# Altium schematic symbol library LATTICEPLDS_Library.SchLib: 291 symbols (part 7 of 32) (continued)
## LCMXO3L/LF-9400-BG484 (continued)
part C pins: A2 PT9B_L_GPLLC (io), A3 PT10B (io), A4 PT11B (io), A5 PT12B (io), A6 PT13B (io), A7 PT14B (io), A8 PT20B (io), A9 PT21B (io), A10 PT23B_PCLKC0_1 (io), A11 PT24B (io), A12 PT27D_SDA/PCLKC0_0 (io), A13 PT29A (io), A14 PT30A (io), A15 PT38A (io), A16 PT39A (io), A17 PT40A (io), A18 PT41A (io), A19 PT42A (io), A20 PT43A_R_GPLLT (io), A21 PT44A_R_GPLLT (io), B1 PT9A_L_GPLLT (io), B2 PT10A (io), B3 PT11A (io), B4 PT12A (io), B5 PT13A (io), B6 PT14A (io), B8 PT20A (io), B9 PT21A (io), B10 PT23A_PCLKT0_1 (io), B11 PT24A (io), B12 PT27C_SCL/PCLKT0_0 (io), B13 PT29B (io), B14 PT30B (io), B15 PT38B (io), B17 PT39B (io), B18 PT40B (io), B19 PT41B (io), B20 PT42B (io), B21 PT43B_R_GPLLC (io), B22 PT44B_R_GPLLC (io), C3 PT10C (io), C4 PT10D (io), C5 PT12D (io), C6 PT14C (io), C8 PT15A (io), C9 PT20C (io), C13 PT29C (io), C14 PT30C (io), C15 PT38C (io), C17 PT39C (io), C18 PT41C (io), C19 PT43C (io), C20 PT43D (io), D5 PT12C (io), D6 PT13C (io), D7 PT14D (io), D8 PT15B (io), D9 PT20D (io), D11 PT24D (io), D12 PT27A (io), D13 PT29D (io), D14 PT30D (io), D15 PT38D (io), D16 PT39D (io), D17 PT40D (io), D18 PT41D (io), E6 PT9C (io), E7 PT13D (io), E10 PT22B (io), E11 PT24C (io), E12 PT27B (io), E13 PT28C (io), E16 PT40C (io), F7 PT9D (io), F8 PT11C (io), F9 PT21C (io), F10 PT22A (io), F11 PT23D (io), F12 PT28B (io), F13 PT28D (io), F14 PT31B (io), F15 PT42C (io), G8 PT11D (io), G9 PT21D (io), G11 PT23C (io), G12 PT28A (io), G14 PT31A (io), G15 PT42D (io)
part D pins: C10 PT22D_TMS (io), D10 PT22C_TCK (io), E8 PT15C_TDO (io), E9 PT15D_TDI (io), E14 PT31C_JTAGENB (io), E15 PT31D_PROGRAMN (io), E17 PT44D_DONE (io), F16 PT44C_INITN (io)
part E pins: C7 VCCIO0_1, C12 VCCIO0_2, C16 VCCIO0_3, F3 VCCIO5_1, F20 VCCIO1_1, G10 VCCIO0_4, G13 VCCIO0_5, H9 VCCIO0_6, H11 VCCIO0_7, H12 VCCIO0_8, H14 VCCIO0_9, J8 VCCIO5_2, J15 VCCIO1_2, K8 VCCIO5_3, K10 VCC1, K11 VCC2, K12 VCC3, K13 VCC4, K15 VCCIO1_3, L8 VCCIO4_1, L11 VCC5, L12 VCC6, L15 VCCIO1_4, M3 VCCIO4_3, M8 VCCIO4_2, M11 VCC7, M12 VCC8, M15 VCCIO1_5, M18 VCCIO1_6, N8 VCCIO3_1, N10 VCC9, N11 VCC10, N12 VCC11, N13 VCC12, N15 VCCIO1_7, P8 VCCIO3_2, P15 VCCIO1_8, R9 VCCIO2_1, R10 VCCIO2_2, R11 VCCIO2_3, R12 VCCIO2_4, R13 VCCIO2_5, R14 VCCIO2_6, V3 VCCIO3_3, V20 VCCIO1_9, W7 VCCIO2_7, W11 VCCIO2_8, W16 VCCIO2_9
part F pins: A1 GND1, A22 GND2, AB1 GND51, AB22 GND52, B7 GND3, B16 GND4, C2 GND5, C11 GND6, E5 GND7, E18 GND8, F2 GND9, F21 GND10, H8 GND11, H10 GND12, H13 GND13, H15 GND14, J9 GND15, J10 GND16, J11 GND17, J12 GND18, J13 GND19, J14 GND20, K9 GND21, K14 GND22, K21 GND23, L2 GND24, L9 GND25, L10 GND26, L13 GND27, L14 GND28, L18 GND29, M4 GND30, M9 GND31, M10 GND32, M13 GND33, M14 GND34, N9 GND35, N14 GND36, N21 GND37, P9 GND38, P10 GND39, P11 GND40, P12 GND41, P13 GND42, P14 GND43, R8 GND44, R15 GND45, V2 GND46, V21 GND47, W12 GND48, Y7 GND49, Y16 GND50
part G pins: AA22 PR29A (io), C21 PR2A_R_GPLLT_FB (io), C22 PR2B_R_GPLLC_FB (io), D19 PR3C (io), D20 PR3D (io), D21 PR3B_R_GPLLC_IN (io), D22 PR3A_R_GPLLT_IN (io), E19 PR4C (io), E20 PR4D (io), E21 PR4B (io), E22 PR4A (io), F17 PR2C (io), F18 PR5C (io), F19 PR5D (io), F22 PR5A (io), G16 PR2D (io), G17 PR7C (io), G18 PR6D (io), G19 PR6C (io), G20 PR6B (io), G21 PR6A (io), G22 PR5B (io), H16 PR10D (io), H17 PR10C (io), H18 PR10B (io), H19 PR10A (io), H20 PR7D (io), H21 PR7B (io), H22 PR7A (io), J16 PR11A (io), J17 PR11B (io), J18 PR11C (io), J19 PR11D (io), J20 PR12C (io), J21 PR12A (io), J22 PR12B (io), K16 PR13D (io), K17 PR13C (io), K18 PR13B (io), K19 PR13A (io), K20 PR12D (io), K22 PR16A (io), L16 PR14B (io), L17 PR14A (io), L19 PR14C (io), L20 PR14D (io), L21 PR16B (io), L22 PR16C (io), M16 PR18A (io), M17 PR16D (io), M19 PR17D (io), M20 PR17C (io), M21 PR17B_PCLKC1_0 (io), M22 PR17A_PCLKT1_0 (io), N16 PR18B (io), N17 PR18C (io), N18 PR18D (io), N19 PR19D (io), N20 PR19C (io), N22 PR19A (io), P16 PR24B (io), P17 PR24A (io), P18 PR21D (io), P19 PR21C (io), P20 PR20D (io), P21 PR19B (io), P22 PR20C (io), R16 PR26C (io), R17 PR26B (io), R18 PR26A (io), R19 PR25D (io), R20 PR25C (io), R21 PR20B (io), R22 PR20A (io), T17 PR27C (io), T18 PR27B (io), T19 PR27A (io), T20 PR26D (io), T21 PR21B (io), T22 PR21A (io), U17 PR29C (io), U18 PR28D (io), U19 PR28C (io), U20 PR27D (io), U21 PR24D (io), U22 PR24C (io), V18 PR30A (io), V19 PR29D (io), V22 PR25A (io), W19 PR30C (io), W20 PR30B (io), W21 PR28B (io), W22 PR25B (io), Y20 PR30D (io), Y21 PR29B (io), Y22 PR28A (io)
part A text: BANK 5; BANK 3; BANK 4
part B text: BANK 2
part C text: BANK 0
part D text: BANK 0
part G text: BANK 1

## LCMXO256-M100/MN100
designator U?  Data Sheet Version: 2.5
SWAP_INFO: (S1+S2); SPLIT_INST: TRUE
part A pins: A1 PT2B (io), A2 PT2D (io), A3 PT2F (io), A4 GNDIO0 (power), A5 PT3B (io), A6 PT3C (io), A7 PT3D (io), A8 PT4B (PCLK0_1) (io), A9 PT4C (io), A10 PT4E (io), A11 PT5A (io), A12 PT5C (io), A13 PR2A (io), A14 VCCIO0 (power), B1 PL2A (io), B2 PT2A (io), B3 PT2E (io), B4 PT3A (io), B5 VCCIO0 (power), B8 PT4A (PCLK0_0) (io), B10 PT4D (io), B11 PT5B (io), B12 PT4F (io), B13 GNDIO0 (power), B14 PR3A (io), C1 PL2B (io), C2 PL3C (io), C3 PT2C (io), C12 PR2B (io), C13 PR3B (io), C14 PR3C (io), D1 PL3B (io), D2 PL3A (io), D13 PR3D (io), D14 PR4A (io), E1 PL3D (io), E2 PL4A (io), E13 PR4B (io), E14 PR5A (io), F1 PL4B (io), F2 PL5A (io), F13 PR5B (io), F14 PR5C (io), G1 VCCIO1 (power), G2 PL5B (io), G13 PR5D (io), G14 GNDIO0 (power), H1 GNDIO1 (power), H2 PL5C (io), H13 PR6A (io), H14 VCCIO0 (power), J1 PL5D (GSRN) (io), J2 PL6A (io), J13 PR6B (io), J14 PR7A (io), K1 PL6B (TSALL) (io), K2 PL7A (io), K13 PR7B (io), K14 PR7C (io), L1 PL7B (io), L2 PL7C (io), L13 PR8B (io), L14 PR8A (io), M1 PL7D (io), M2 PL8A (io), M3 PL9A (io), M13 PR7D (io), M14 PR9A (io), N1 PL8B (io), N2 GNDIO1 (power), N3 PB2B (io), N4 TCK (io), N5 PB2C (io), N6 PB2D (io), N7 PB3A (PCLK1_1) (io), N8 PB3C (PCLK1_0) (io), N10 GNDIO1 (power), N11 PB4B (io), N12 PB4D (io), N13 PB5D (io), N14 PR9B (io), P1 VCCIO1 (power), P2 TMS (io), P3 PL9B (io), P4 PB2A (io), P5 TDO (io), P6 TDI (io), P8 PB3B (io), P9 PB3D (io), P10 VCCIO1 (power), P11 PB4A (io), P12 PB4C (io), P13 PB5A (io), P14 PB5C (io)
part B pins: B6 VCC (power), B7 VCCAUX (power), B9 GND (power), M12 SLEEPN (io), N9 GND (power), P7 VCC (power)
part A text: (1 of 2)
part B text: (2 of 2); M12 is NC for E devices

## LCMXO256-T100/TN100
designator U?  Data Sheet Version: 2.7
pins: 1 PL2A, 2 PL2B, 3 PL3A, 4 PL3B, 5 PL3C, 6 PL3D, 7 PL4A, 8 PL4B, 9 PL5A, 10 VCCIO1, 11 PL5B, 12 GNDIO1, 13 PL5C, 14 PL5D, 15 PL6A, 16 PL6B, 17 PL7A, 18 PL7B, 19 PL7C, 20 PL7D, 21 PL8A, 22 PL8B, 23 PL9A, 24 VCCIO1, 25 GNDIO1, 26 TMS, 27 PL9B, 28 TCK, 29 PB2A, 30 PB2B, 31 TDO, 32 PB2C, 33 TDI, 34 PB2D, 35 VCC, 36 PB3A, 37 PB3B, 38 PB3C, 39 PB3D, 40 GND, 41 VCCIO1, 42 GNDIO1, 43 PB4A, 44 PB4B, 45 PB4C, 46 PB4D, 47 PB5A, 48 SLEEPN/NC, 49 PB5C, 50 PB5D, 51 PR9B, 52 PR9A, 53 PR8B, 54 PR8A, 55 PR7D, 56 PR7C, 57 PR7B, 58 PR7A, 59 PR6B, 60 VCCIO0, 61 PR6A, 62 GNDIO0, 63 PR5D, 64 PR5C, 65 PR5B, 66 PR5A, 67 PR4B, 68 PR4A, 69 PR3D, 70 PR3C, 71 PR3B, 72 PR3A, 73 PR2B, 74 VCCIO0, 75 GNDIO0, 76 PR2A, 77 PT5C, 78 PT5B, 79 PT5A, 80 PT4F, 81 PT4E, 82 PT4D, 83 PT4C, 84 GND, 85 PT4B, 86 PT4A, 87 PT3D, 88 VCCAUX, 89 PT3C, 90 VCC, 91 PT3B, 92 VCCIO0, 93 GNDIO0, 94 PT3A, 95 PT2F, 96 PT2E, 97 PT2D, 98 PT2C, 99 PT2B, 100 PT2A

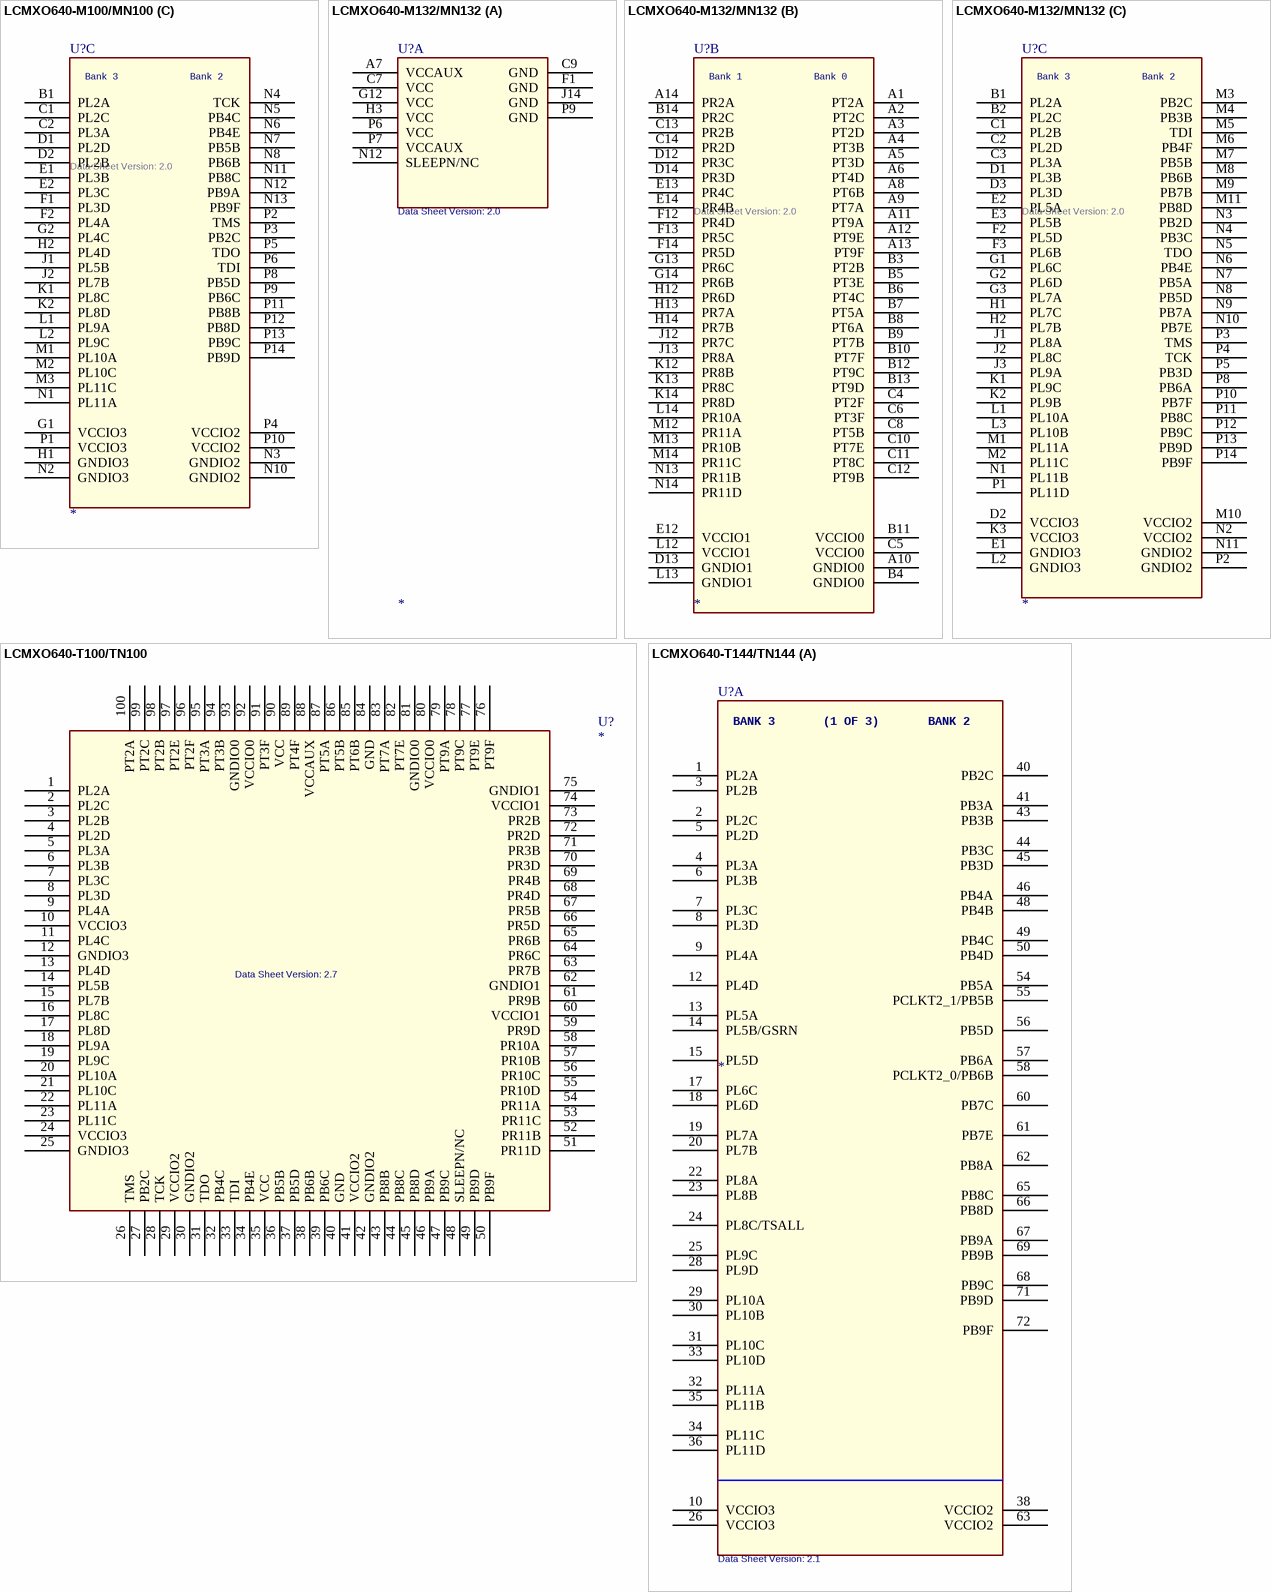
[diagram p69: symbols LCMXO640-M100/MN100 to LCMXO640-T144/TN144]

## LCMXO640-M100/MN100
designator U?  Data Sheet Version: 2.0
SPLIT_INST: TRUE; SWAP_INFO: (S1+S2+S3)
part A pins: B6 VCC (power), B7 VCCAUX (power), B9 GND (power), M12 SLEEPN/NC, N9 GND (power), P7 VCC (power)
part B pins: A1 PT2C, A2 PT2E, A3 PT3A, A4 GNDIO0 (power), A5 PT3F, A6 PT4F, A7 PT5A, A8 PT6B, A9 PT7A, A10 GNDIO0 (power), A11 PT9A, A12 PT9E, A13 PT9F, A14 VCCIO1, B2 PT2A, B3 PT2F, B4 PT3B, B5 VCCIO0, B8 PT5B, B10 PT7E, B11 PT9C, B12 VCCIO0, B13 GNDIO1 (power), B14 PR2D, C3 PT2B, C12 PR2B, C13 PR3B, C14 PR3D, D13 PR4B, D14 PR4D, E13 PR5B, E14 PR5D, F13 PR6B, F14 PR6C, G13 PR7B, G14 GNDIO1 (power), H13 PR9B, H14 VCCIO1, J13 PR9D, J14 PR10A, K13 PR10B, K14 PR10C, L13 PR11C, L14 PR11A, M13 PR10D, M14 PR11B, N14 PR11D
part C pins: B1 PL2A, C1 PL2C, C2 PL3A, D1 PL2D, D2 PL2B, E1 PL3B, E2 PL3C, F1 PL3D, F2 PL4A, G1 VCCIO3, G2 PL4C, H1 GNDIO3 (power), H2 PL4D, J1 PL5B, J2 PL7B, K1 PL8C, K2 PL8D, L1 PL9A, L2 PL9C, M1 PL10A, M2 PL10C, M3 PL11C, N1 PL11A, N2 GNDIO3 (power), N3 GNDIO2 (power), N4 TCK, N5 PB4C, N6 PB4E, N7 PB5B, N8 PB6B, N10 GNDIO2 (power), N11 PB8C, N12 PB9A, N13 PB9F, P1 VCCIO3, P2 TMS, P3 PB2C, P4 VCCIO2, P5 TDO, P6 TDI, P8 PB5D, P9 PB6C, P10 VCCIO2, P11 PB8B, P12 PB8D, P13 PB9C, P14 PB9D
part B text: Bank 1; Bank 0
part C text: Bank 3; Bank 2

## LCMXO640-M132/MN132
designator U?  Data Sheet Version: 2.0
SWAP_INFO: (S1+S2+S3); SPLIT_INST: TRUE
part A pins: A7 VCCAUX (power), C7 VCC (power), C9 GND (power), F1 GND (power), G12 VCC (power), H3 VCC (power), J14 GND (power), N12 SLEEPN/NC, P6 VCC (power), P7 VCCAUX (power), P9 GND (power)
part B pins: A1 PT2A, A2 PT2C, A3 PT2D, A4 PT3B, A5 PT3D, A6 PT4D, A8 PT6B, A9 PT7A, A10 GNDIO0 (power), A11 PT9A, A12 PT9E, A13 PT9F, A14 PR2A, B3 PT2B, B4 GNDIO0 (power), B5 PT3E, B6 PT4C, B7 PT5A, B8 PT6A, B9 PT7B, B10 PT7F, B11 VCCIO0, B12 PT9C, B13 PT9D, B14 PR2C, C4 PT2F, C5 VCCIO0, C6 PT3F, C8 PT5B, C10 PT7E, C11 PT8C, C12 PT9B, C13 PR2B, C14 PR2D, D12 PR3C, D13 GNDIO1 (power), D14 PR3D, E12 VCCIO1, E13 PR4C, E14 PR4B, F12 PR4D, F13 PR5C, F14 PR5D, G13 PR6C, G14 PR6B, H12 PR6D, H13 PR7A, H14 PR7B, J12 PR7C, J13 PR8A, K12 PR8B, K13 PR8C, K14 PR8D, L12 VCCIO1, L13 GNDIO1 (power), L14 PR10A, M12 PR11A, M13 PR10B, M14 PR11C, N13 PR11B, N14 PR11D
part C pins: B1 PL2A, B2 PL2C, C1 PL2B, C2 PL2D, C3 PL3A, D1 PL3B, D2 VCCIO3, D3 PL3D, E1 GNDIO3 (power), E2 PL5A, E3 PL5B, F2 PL5D, F3 PL6B, G1 PL6C, G2 PL6D, G3 PL7A, H1 PL7C, H2 PL7B, J1 PL8A, J2 PL8C, J3 PL9A, K1 PL9C, K2 PL9B, K3 VCCIO3, L1 PL10A, L2 GNDIO3 (power), L3 PL10B, M1 PL11A, M2 PL11C, M3 PB2C, M4 PB3B, M5 TDI, M6 PB4F, M7 PB5B, M8 PB6B, M9 PB7B, M10 VCCIO2, M11 PB8D, N1 PL11B, N2 VCCIO2, N3 PB2D, N4 PB3C, N5 TDO, N6 PB4E, N7 PB5A, N8 PB5D, N9 PB7A, N10 PB7E, N11 GNDIO2 (power), P1 PL11D, P2 GNDIO2 (power), P3 TMS, P4 TCK, P5 PB3D, P8 PB6A, P10 PB7F, P11 PB8C, P12 PB9C, P13 PB9D, P14 PB9F
part B text: Bank 1; Bank 0
part C text: Bank 3; Bank 2

## LCMXO640-T100/TN100
designator U?  Data Sheet Version: 2.7
pins: 1 PL2A, 2 PL2C, 3 PL2B, 4 PL2D, 5 PL3A, 6 PL3B, 7 PL3C, 8 PL3D, 9 PL4A, 10 VCCIO3, 11 PL4C, 12 GNDIO3, 13 PL4D, 14 PL5B, 15 PL7B, 16 PL8C, 17 PL8D, 18 PL9A, 19 PL9C, 20 PL10A, 21 PL10C, 22 PL11A, 23 PL11C, 24 VCCIO3, 25 GNDIO3, 26 TMS, 27 PB2C, 28 TCK, 29 VCCIO2, 30 GNDIO2, 31 TDO, 32 PB4C, 33 TDI, 34 PB4E, 35 VCC, 36 PB5B, 37 PB5D, 38 PB6B, 39 PB6C, 40 GND, 41 VCCIO2, 42 GNDIO2, 43 PB8B, 44 PB8C, 45 PB8D, 46 PB9A, 47 PB9C, 48 SLEEPN/NC, 49 PB9D, 50 PB9F, 51 PR11D, 52 PR11B, 53 PR11C, 54 PR11A, 55 PR10D, 56 PR10C, 57 PR10B, 58 PR10A, 59 PR9D, 60 VCCIO1, 61 PR9B, 62 GNDIO1, 63 PR7B, 64 PR6C, 65 PR6B, 66 PR5D, 67 PR5B, 68 PR4D, 69 PR4B, 70 PR3D, 71 PR3B, 72 PR2D, 73 PR2B, 74 VCCIO1, 75 GNDIO1, 76 PT9F, 77 PT9E, 78 PT9C, 79 PT9A, 80 VCCIO0, 81 GNDIO0, 82 PT7E, 83 PT7A, 84 GND, 85 PT6B, 86 PT5B, 87 PT5A, 88 VCCAUX, 89 PT4F, 90 VCC, 91 PT3F, 92 VCCIO0, 93 GNDIO0, 94 PT3B, 95 PT3A, 96 PT2F, 97 PT2E, 98 PT2B, 99 PT2C, 100 PT2A

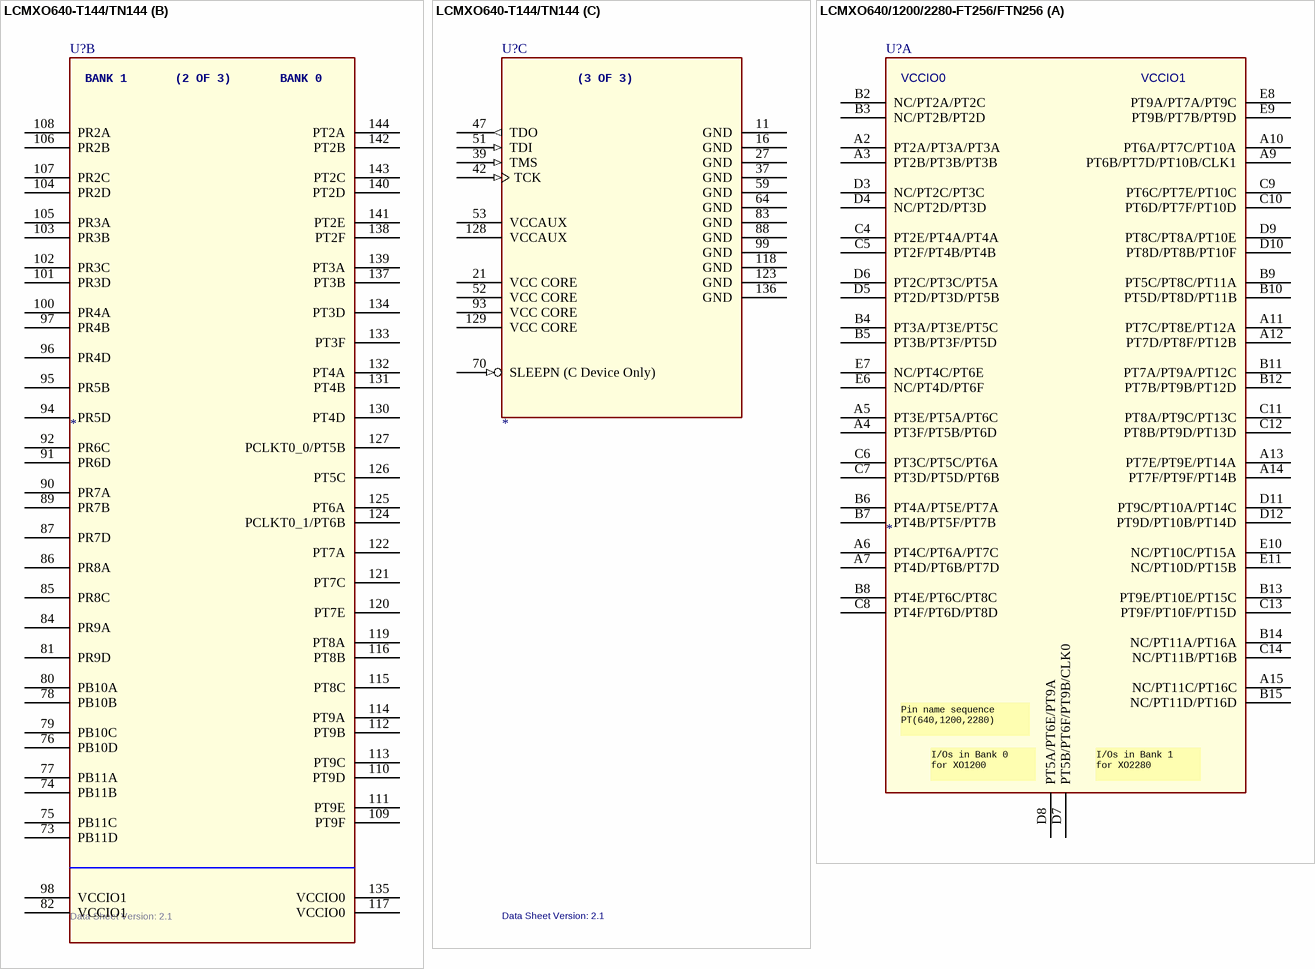
[diagram p70: symbols LCMXO640-T144/TN144 to LCMXO640/1200/2280-FT256/FTN256]

## LCMXO640-T144/TN144
designator U?  Data Sheet Version: 2.1
footprint TQFP144
part A pins: 1 PL2A, 2 PL2C, 3 PL2B, 4 PL3A, 5 PL2D, 6 PL3B, 7 PL3C, 8 PL3D, 9 PL4A, 10 VCCIO3 (power), 12 PL4D, 13 PL5A, 14 PL5B/GSRN, 15 PL5D, 17 PL6C, 18 PL6D, 19 PL7A, 20 PL7B, 22 PL8A, 23 PL8B, 24 PL8C/TSALL, 25 PL9C, 26 VCCIO3 (power), 28 PL9D, 29 PL10A, 30 PL10B, 31 PL10C, 32 PL11A, 33 PL10D, 34 PL11C, 35 PL11B, 36 PL11D, 38 VCCIO2 (power), 40 PB2C, 41 PB3A, 43 PB3B, 44 PB3C, 45 PB3D, 46 PB4A, 48 PB4B, 49 PB4C, 50 PB4D, 54 PB5A, 55 PCLKT2_1/PB5B, 56 PB5D, 57 PB6A, 58 PCLKT2_0/PB6B, 60 PB7C, 61 PB7E, 62 PB8A, 63 VCCIO2 (power), 65 PB8C, 66 PB8D, 67 PB9A, 68 PB9C, 69 PB9B, 71 PB9D, 72 PB9F
part B pins: 73 PB11D, 74 PB11B, 75 PB11C, 76 PB10D, 77 PB11A, 78 PB10B, 79 PB10C, 80 PB10A, 81 PR9D, 82 VCCIO1 (power), 84 PR9A, 85 PR8C, 86 PR8A, 87 PR7D, 89 PR7B, 90 PR7A, 91 PR6D, 92 PR6C, 94 PR5D, 95 PR5B, 96 PR4D, 97 PR4B, 98 VCCIO1 (power), 100 PR4A, 101 PR3D, 102 PR3C, 103 PR3B, 104 PR2D, 105 PR3A, 106 PR2B, 107 PR2C, 108 PR2A, 109 PT9F, 110 PT9D, 111 PT9E, 112 PT9B, 113 PT9C, 114 PT9A, 115 PT8C, 116 PT8B, 117 VCCIO0 (power), 119 PT8A, 120 PT7E, 121 PT7C, 122 PT7A, 124 PCLKT0_1/PT6B, 125 PT6A, 126 PT5C, 127 PCLKT0_0/PT5B, 130 PT4D, 131 PT4B, 132 PT4A, 133 PT3F, 134 PT3D, 135 VCCIO0 (power), 137 PT3B, 138 PT2F, 139 PT3A, 140 PT2D, 141 PT2E, 142 PT2B, 143 PT2C, 144 PT2A
part C pins: 11 GND (power), 16 GND (power), 21 VCC CORE (power), 27 GND (power), 37 GND (power), 39 TMS (in), 42 TCK (in), 47 TDO (out), 51 TDI (in), 52 VCC CORE (power), 53 VCCAUX (power), 59 GND (power), 64 GND (power), 70 SLEEPN (C Device Only) (in), 83 GND (power), 88 GND (power), 93 VCC CORE (power), 99 GND (power), 118 GND (power), 123 GND (power), 128 VCCAUX (power), 129 VCC CORE (power), 136 GND (power)
part A text: BANK 3; (1 OF 3); BANK 2
part B text: BANK 1; (2 OF 3); BANK 0
part C text: (3 OF 3)

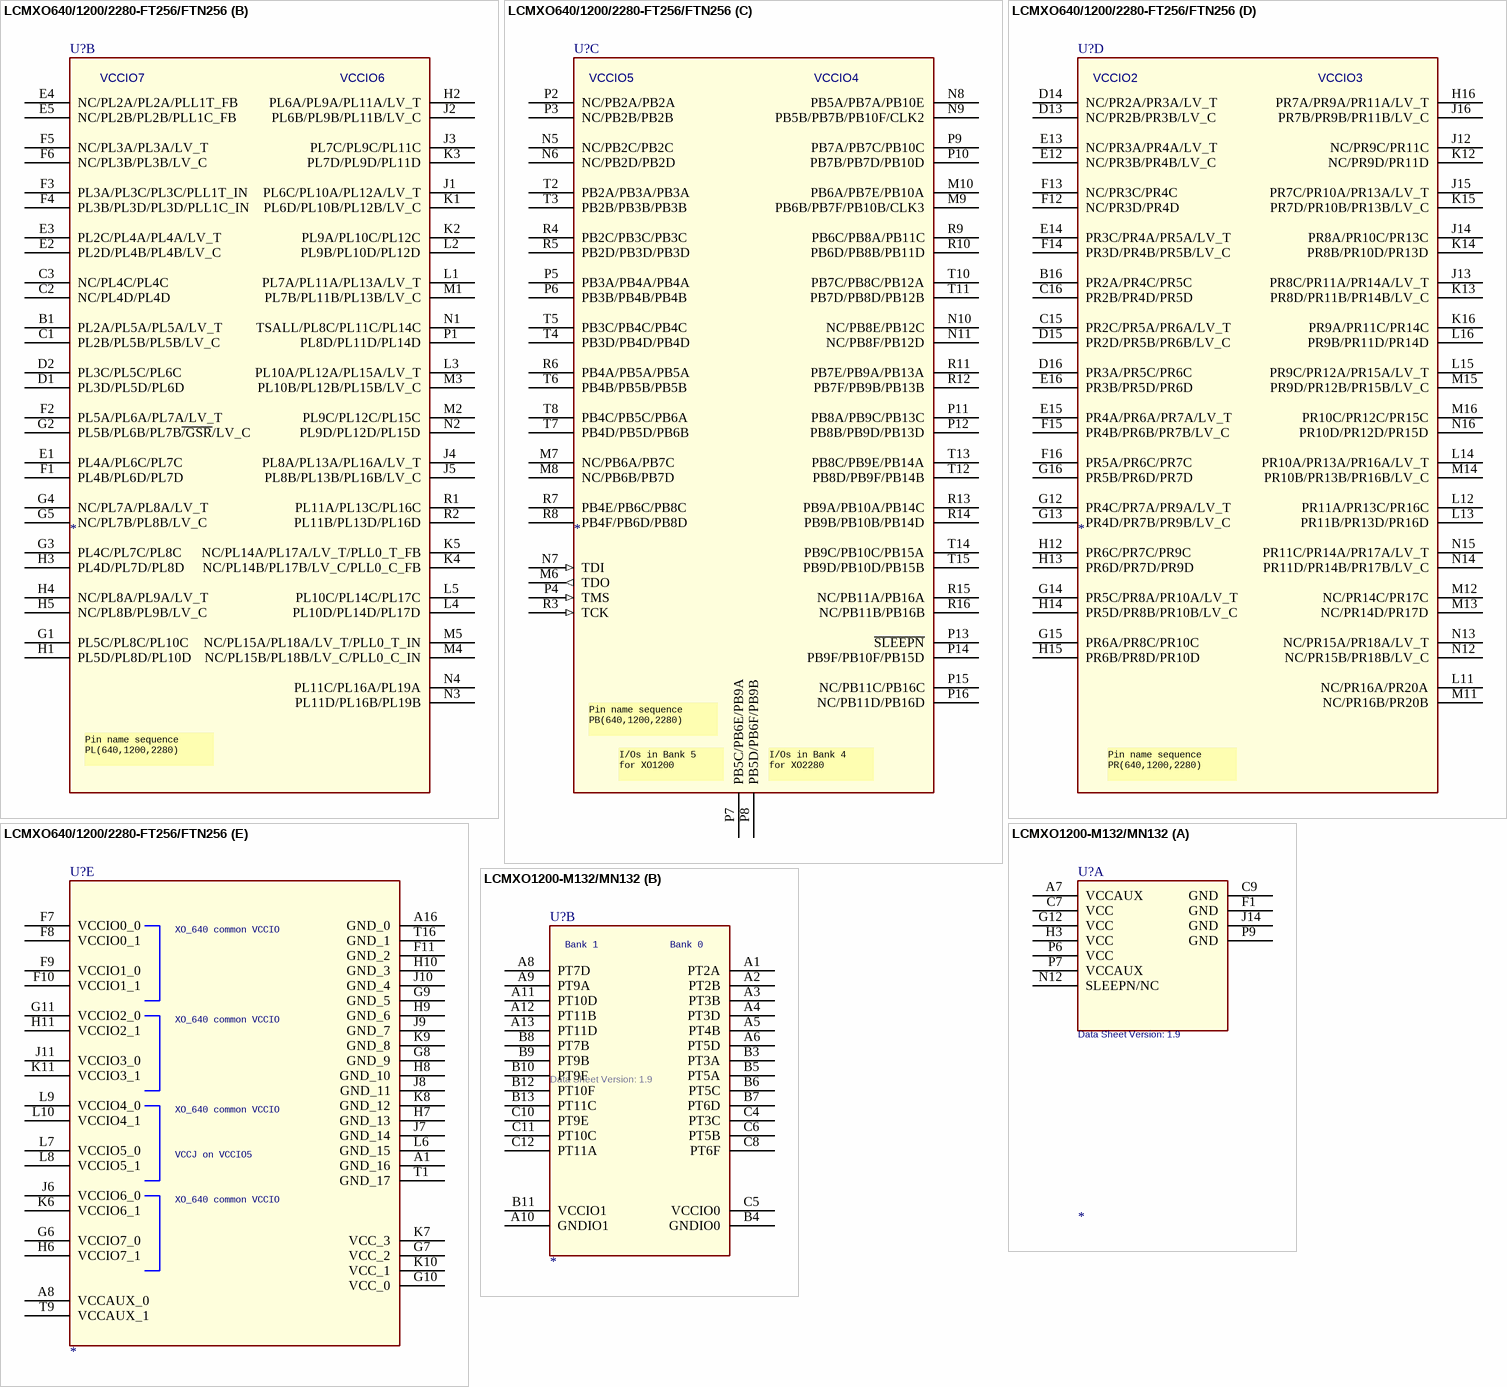
[diagram p71: symbols LCMXO640/1200/2280-FT256/FTN256 to LCMXO1200-M132/MN132]

## LCMXO640/1200/2280-FT256/FTN256
designator U?
part A pins: A2 PT2A/PT3A/PT3A (hiz), A3 PT2B/PT3B/PT3B (hiz), A4 PT3F/PT5B/PT6D (hiz), A5 PT3E/PT5A/PT6C (hiz), A6 PT4C/PT6A/PT7C (hiz), A7 PT4D/PT6B/PT7D (hiz), A9 PT6B/PT7D/PT10B/CLK1 (hiz), A10 PT6A/PT7C/PT10A (hiz), A11 PT7C/PT8E/PT12A (hiz), A12 PT7D/PT8F/PT12B (hiz), A13 PT7E/PT9E/PT14A (hiz), A14 PT7F/PT9F/PT14B (hiz), A15 NC/PT11C/PT16C (hiz), B2 NC/PT2A/PT2C (hiz), B3 NC/PT2B/PT2D (hiz), B4 PT3A/PT3E/PT5C (hiz), B5 PT3B/PT3F/PT5D (hiz), B6 PT4A/PT5E/PT7A (hiz), B7 PT4B/PT5F/PT7B (hiz), B8 PT4E/PT6C/PT8C (hiz), B9 PT5C/PT8C/PT11A (hiz), B10 PT5D/PT8D/PT11B (hiz), B11 PT7A/PT9A/PT12C (hiz), B12 PT7B/PT9B/PT12D (hiz), B13 PT9E/PT10E/PT15C (hiz), B14 NC/PT11A/PT16A (hiz), B15 NC/PT11D/PT16D (hiz), C4 PT2E/PT4A/PT4A (hiz), C5 PT2F/PT4B/PT4B (hiz), C6 PT3C/PT5C/PT6A (hiz), C7 PT3D/PT5D/PT6B (hiz), C8 PT4F/PT6D/PT8D (hiz), C9 PT6C/PT7E/PT10C (hiz), C10 PT6D/PT7F/PT10D (hiz), C11 PT8A/PT9C/PT13C (hiz), C12 PT8B/PT9D/PT13D (hiz), C13 PT9F/PT10F/PT15D (hiz), C14 NC/PT11B/PT16B (hiz), D3 NC/PT2C/PT3C (hiz), D4 NC/PT2D/PT3D (hiz), D5 PT2D/PT3D/PT5B (hiz), D6 PT2C/PT3C/PT5A (hiz), D7 PT5B/PT6F/PT9B/CLK0 (hiz), D8 PT5A/PT6E/PT9A (hiz), D9 PT8C/PT8A/PT10E (hiz), D10 PT8D/PT8B/PT10F (hiz), D11 PT9C/PT10A/PT14C (hiz), D12 PT9D/PT10B/PT14D (hiz), E6 NC/PT4D/PT6F (hiz), E7 NC/PT4C/PT6E (hiz), E8 PT9A/PT7A/PT9C (hiz), E9 PT9B/PT7B/PT9D (hiz), E10 NC/PT10C/PT15A (hiz), E11 NC/PT10D/PT15B (hiz)
part B pins: B1 PL2A/PL5A/PL5A/LV_T (hiz), C1 PL2B/PL5B/PL5B/LV_C (hiz), C2 NC/PL4D/PL4D (hiz), C3 NC/PL4C/PL4C (hiz), D1 PL3D/PL5D/PL6D (hiz), D2 PL3C/PL5C/PL6C (hiz), E1 PL4A/PL6C/PL7C (hiz), E2 PL2D/PL4B/PL4B/LV_C (hiz), E3 PL2C/PL4A/PL4A/LV_T (hiz), E4 NC/PL2A/PL2A/PLL1T_FB (hiz), E5 NC/PL2B/PL2B/PLL1C_FB (hiz), F1 PL4B/PL6D/PL7D, F2 PL5A/PL6A/PL7A/LV_T (hiz), F3 PL3A/PL3C/PL3C/PLL1T_IN (hiz), F4 PL3B/PL3D/PL3D/PLL1C_IN (hiz), F5 NC/PL3A/PL3A/LV_T (hiz), F6 NC/PL3B/PL3B/LV_C (hiz), G1 PL5C/PL8C/PL10C, G2 PL5B/PL6B/PL7B~{/GSR}/LV_C (hiz), G3 PL4C/PL7C/PL8C, G4 NC/PL7A/PL8A/LV_T, G5 NC/PL7B/PL8B/LV_C, H1 PL5D/PL8D/PL10D, H2 PL6A/PL9A/PL11A/LV_T, H3 PL4D/PL7D/PL8D, H4 NC/PL8A/PL9A/LV_T, H5 NC/PL8B/PL9B/LV_C, J1 PL6C/PL10A/PL12A/LV_T (hiz), J2 PL6B/PL9B/PL11B/LV_C, J3 PL7C/PL9C/PL11C (hiz), J4 PL8A/PL13A/PL16A/LV_T (hiz), J5 PL8B/PL13B/PL16B/LV_C (hiz), K1 PL6D/PL10B/PL12B/LV_C (hiz), K2 PL9A/PL10C/PL12C (hiz), K3 PL7D/PL9D/PL11D (hiz), K4 NC/PL14B/PL17B/LV_C/PLL0_C_FB (hiz), K5 NC/PL14A/PL17A/LV_T/PLL0_T_FB (hiz), L1 PL7A/PL11A/PL13A/LV_T (hiz), L2 PL9B/PL10D/PL12D (hiz), L3 PL10A/PL12A/PL15A/LV_T (hiz), L4 PL10D/PL14D/PL17D (hiz), L5 PL10C/PL14C/PL17C (hiz), M1 PL7B/PL11B/PL13B/LV_C (hiz), M2 PL9C/PL12C/PL15C (hiz), M3 PL10B/PL12B/PL15B/LV_C (hiz), M4 NC/PL15B/PL18B/LV_C/PLL0_C_IN (hiz), M5 NC/PL15A/PL18A/LV_T/PLL0_T_IN (hiz), N1 TSALL/PL8C/PL11C/PL14C (hiz), N2 PL9D/PL12D/PL15D (hiz), N3 PL11D/PL16B/PL19B (hiz), N4 PL11C/PL16A/PL19A (hiz), P1 PL8D/PL11D/PL14D (hiz), R1 PL11A/PL13C/PL16C (hiz), R2 PL11B/PL13D/PL16D (hiz)
part C pins: M6 TDO (out), M7 NC/PB6A/PB7C (hiz), M8 NC/PB6B/PB7D (hiz), M9 PB6B/PB7F/PB10B/CLK3 (hiz), M10 PB6A/PB7E/PB10A (hiz), N5 NC/PB2C/PB2C (hiz), N6 NC/PB2D/PB2D (hiz), N7 TDI (in), N8 PB5A/PB7A/PB10E (hiz), N9 PB5B/PB7B/PB10F/CLK2 (hiz), N10 NC/PB8E/PB12C (hiz), N11 NC/PB8F/PB12D (hiz), P2 NC/PB2A/PB2A (hiz), P3 NC/PB2B/PB2B (hiz), P4 TMS (in), P5 PB3A/PB4A/PB4A (hiz), P6 PB3B/PB4B/PB4B (hiz), P7 PB5C/PB6E/PB9A (hiz), P8 PB5D/PB6F/PB9B (hiz), P9 PB7A/PB7C/PB10C (hiz), P10 PB7B/PB7D/PB10D (hiz), P11 PB8A/PB9C/PB13C (hiz), P12 PB8B/PB9D/PB13D (hiz), P13 ~{SLEEPN} (hiz), P14 PB9F/PB10F/PB15D (hiz), P15 NC/PB11C/PB16C (hiz), P16 NC/PB11D/PB16D (hiz), R3 TCK (in), R4 PB2C/PB3C/PB3C (hiz), R5 PB2D/PB3D/PB3D (hiz), R6 PB4A/PB5A/PB5A (hiz), R7 PB4E/PB6C/PB8C (hiz), R8 PB4F/PB6D/PB8D (hiz), R9 PB6C/PB8A/PB11C (hiz), R10 PB6D/PB8B/PB11D (hiz), R11 PB7E/PB9A/PB13A (hiz), R12 PB7F/PB9B/PB13B (hiz), R13 PB9A/PB10A/PB14C (hiz), R14 PB9B/PB10B/PB14D (hiz), R15 NC/PB11A/PB16A (hiz), R16 NC/PB11B/PB16B (hiz), T2 PB2A/PB3A/PB3A (hiz), T3 PB2B/PB3B/PB3B (hiz), T4 PB3D/PB4D/PB4D (hiz), T5 PB3C/PB4C/PB4C (hiz), T6 PB4B/PB5B/PB5B (hiz), T7 PB4D/PB5D/PB6B (hiz), T8 PB4C/PB5C/PB6A (hiz), T10 PB7C/PB8C/PB12A (hiz), T11 PB7D/PB8D/PB12B (hiz), T12 PB8D/PB9F/PB14B (hiz), T13 PB8C/PB9E/PB14A (hiz), T14 PB9C/PB10C/PB15A (hiz), T15 PB9D/PB10D/PB15B (hiz)
part D pins: B16 PR2A/PR4C/PR5C (hiz), C15 PR2C/PR5A/PR6A/LV_T, C16 PR2B/PR4D/PR5D (hiz), D13 NC/PR2B/PR3B/LV_C (hiz), D14 NC/PR2A/PR3A/LV_T (hiz), D15 PR2D/PR5B/PR6B/LV_C, D16 PR3A/PR5C/PR6C (hiz), E12 NC/PR3B/PR4B/LV_C (hiz), E13 NC/PR3A/PR4A/LV_T (hiz), E14 PR3C/PR4A/PR5A/LV_T (hiz), E15 PR4A/PR6A/PR7A/LV_T, E16 PR3B/PR5D/PR6D (hiz), F12 NC/PR3D/PR4D (hiz), F13 NC/PR3C/PR4C (hiz), F14 PR3D/PR4B/PR5B/LV_C (hiz), F15 PR4B/PR6B/PR7B/LV_C, F16 PR5A/PR6C/PR7C (hiz), G12 PR4C/PR7A/PR9A/LV_T, G13 PR4D/PR7B/PR9B/LV_C, G14 PR5C/PR8A/PR10A/LV_T, G15 PR6A/PR8C/PR10C (hiz), G16 PR5B/PR6D/PR7D (hiz), H12 PR6C/PR7C/PR9C (hiz), H13 PR6D/PR7D/PR9D (hiz), H14 PR5D/PR8B/PR10B/LV_C, H15 PR6B/PR8D/PR10D, H16 PR7A/PR9A/PR11A/LV_T, J12 NC/PR9C/PR11C, J13 PR8C/PR11A/PR14A/LV_T, J14 PR8A/PR10C/PR13C, J15 PR7C/PR10A/PR13A/LV_T, J16 PR7B/PR9B/PR11B/LV_C, K12 NC/PR9D/PR11D, K13 PR8D/PR11B/PR14B/LV_C, K14 PR8B/PR10D/PR13D, K15 PR7D/PR10B/PR13B/LV_C, K16 PR9A/PR11C/PR14C, L11 NC/PR16A/PR20A (hiz), L12 PR11A/PR13C/PR16C (hiz), L13 PR11B/PR13D/PR16D (hiz), L14 PR10A/PR13A/PR16A/LV_T (hiz), L15 PR9C/PR12A/PR15A/LV_T, L16 PR9B/PR11D/PR14D, M11 NC/PR16B/PR20B (hiz), M12 NC/PR14C/PR17C (hiz), M13 NC/PR14D/PR17D (hiz), M14 PR10B/PR13B/PR16B/LV_C (hiz), M15 PR9D/PR12B/PR15B/LV_C, M16 PR10C/PR12C/PR15C (hiz), N12 NC/PR15B/PR18B/LV_C (hiz), N13 NC/PR15A/PR18A/LV_T (hiz), N14 PR11D/PR14B/PR17B/LV_C (hiz), N15 PR11C/PR14A/PR17A/LV_T (hiz), N16 PR10D/PR12D/PR15D (hiz)
part E pins: A1 GND_16 (power), A8 VCCAUX_0 (power), A16 GND_0 (power), F7 VCCIO0_0 (power), F8 VCCIO0_1 (power), F9 VCCIO1_0 (power), F10 VCCIO1_1 (power), F11 GND_2 (power), G6 VCCIO7_0 (power), G7 VCC_2 (power), G8 GND_9 (power), G9 GND_5 (power), G10 VCC_0 (power), G11 VCCIO2_0 (power), H6 VCCIO7_1 (power), H7 GND_13 (power), H8 GND_10 (power), H9 GND_6 (power), H10 GND_3 (power), H11 VCCIO2_1 (power), J6 VCCIO6_0 (power), J7 GND_14 (power), J8 GND_11 (power), J9 GND_7 (power), J10 GND_4 (power), J11 VCCIO3_0 (power), K6 VCCIO6_1 (power), K7 VCC_3 (power), K8 GND_12 (power), K9 GND_8 (power), K10 VCC_1 (power), K11 VCCIO3_1 (power), L6 GND_15 (power), L7 VCCIO5_0 (power), L8 VCCIO5_1 (power), L9 VCCIO4_0 (power), L10 VCCIO4_1 (power), T1 GND_17 (power), T9 VCCAUX_1 (power), T16 GND_1 (power)
